# Altium schematic symbol library 13-Analog D 数模模数.SchLib: 573 symbols (part 3 of 6) (continued)
## DAC904 (continued)

## DAC1220E
designator IC?
20-Bit, Low-Power Digital-to-Analog Converter
pins: 1 DVDD (power), 2 XOUT (out), 3 XIN (in), 4 DGND (power), 5 AVDD (power), 6 DNC, 7 DNC, 8 DNC, 9 C1, 10 C2, 11 VOUT (out), 12 VREF (in), 13 AGND (power), 14 ~{CS} (in), 15 SDIO (io), 16 SCLK (in)

## DAC5311
designator IC?
1.8V to 5.5V, 80uA, 8-Bit, Low-Power, Single-Channel, DAC
pins: 1 ~{SYNC} (in), 2 SCLK (in), 3 DIN (in), 4 AVDD (power), 5 GND (power), 6 VOUT (out)

## DAC5578SRGE
designator IC?
8-Bit, Octal-Channel, Ultra-Low Glitch, Voltage Output, Two-Wire Interface Digital-to-Analog Converter
pins: 1 NC (out), 2 AVDD (power), 3 VOUTA (out), 4 VOUTC (out), 5 VOUTE (out), 6 VOUTG (out), 7 NC, 8 VREFIN (in), 9 RSTSEL (in), 10 ADDR1 (in), 11 ADDR0 (in), 12 ~{CLR} (in), 13 VOUTH (out), 14 VOUTF (out), 15 VOUTD (out), 16 VOUTB (out), 17 GND (power), 18 NC, 19 SDA (in), 20 SCL (in), 21 TWOC (in), 22 ~{LDAC} (in), 23 NC, 24 NC, 25 EP (power)

## DAC7612
designator IC?
Dual, 12-Bit Serial Input Digital-To-Analog Converter
pins: 1 SDI (in), 2 CLK (in), 3 ~{LDDACS} (in), 4 ~{CS} (in), 5 VOUTB (out), 6 GND (power), 7 VDD (in), 8 VOUTA (out)

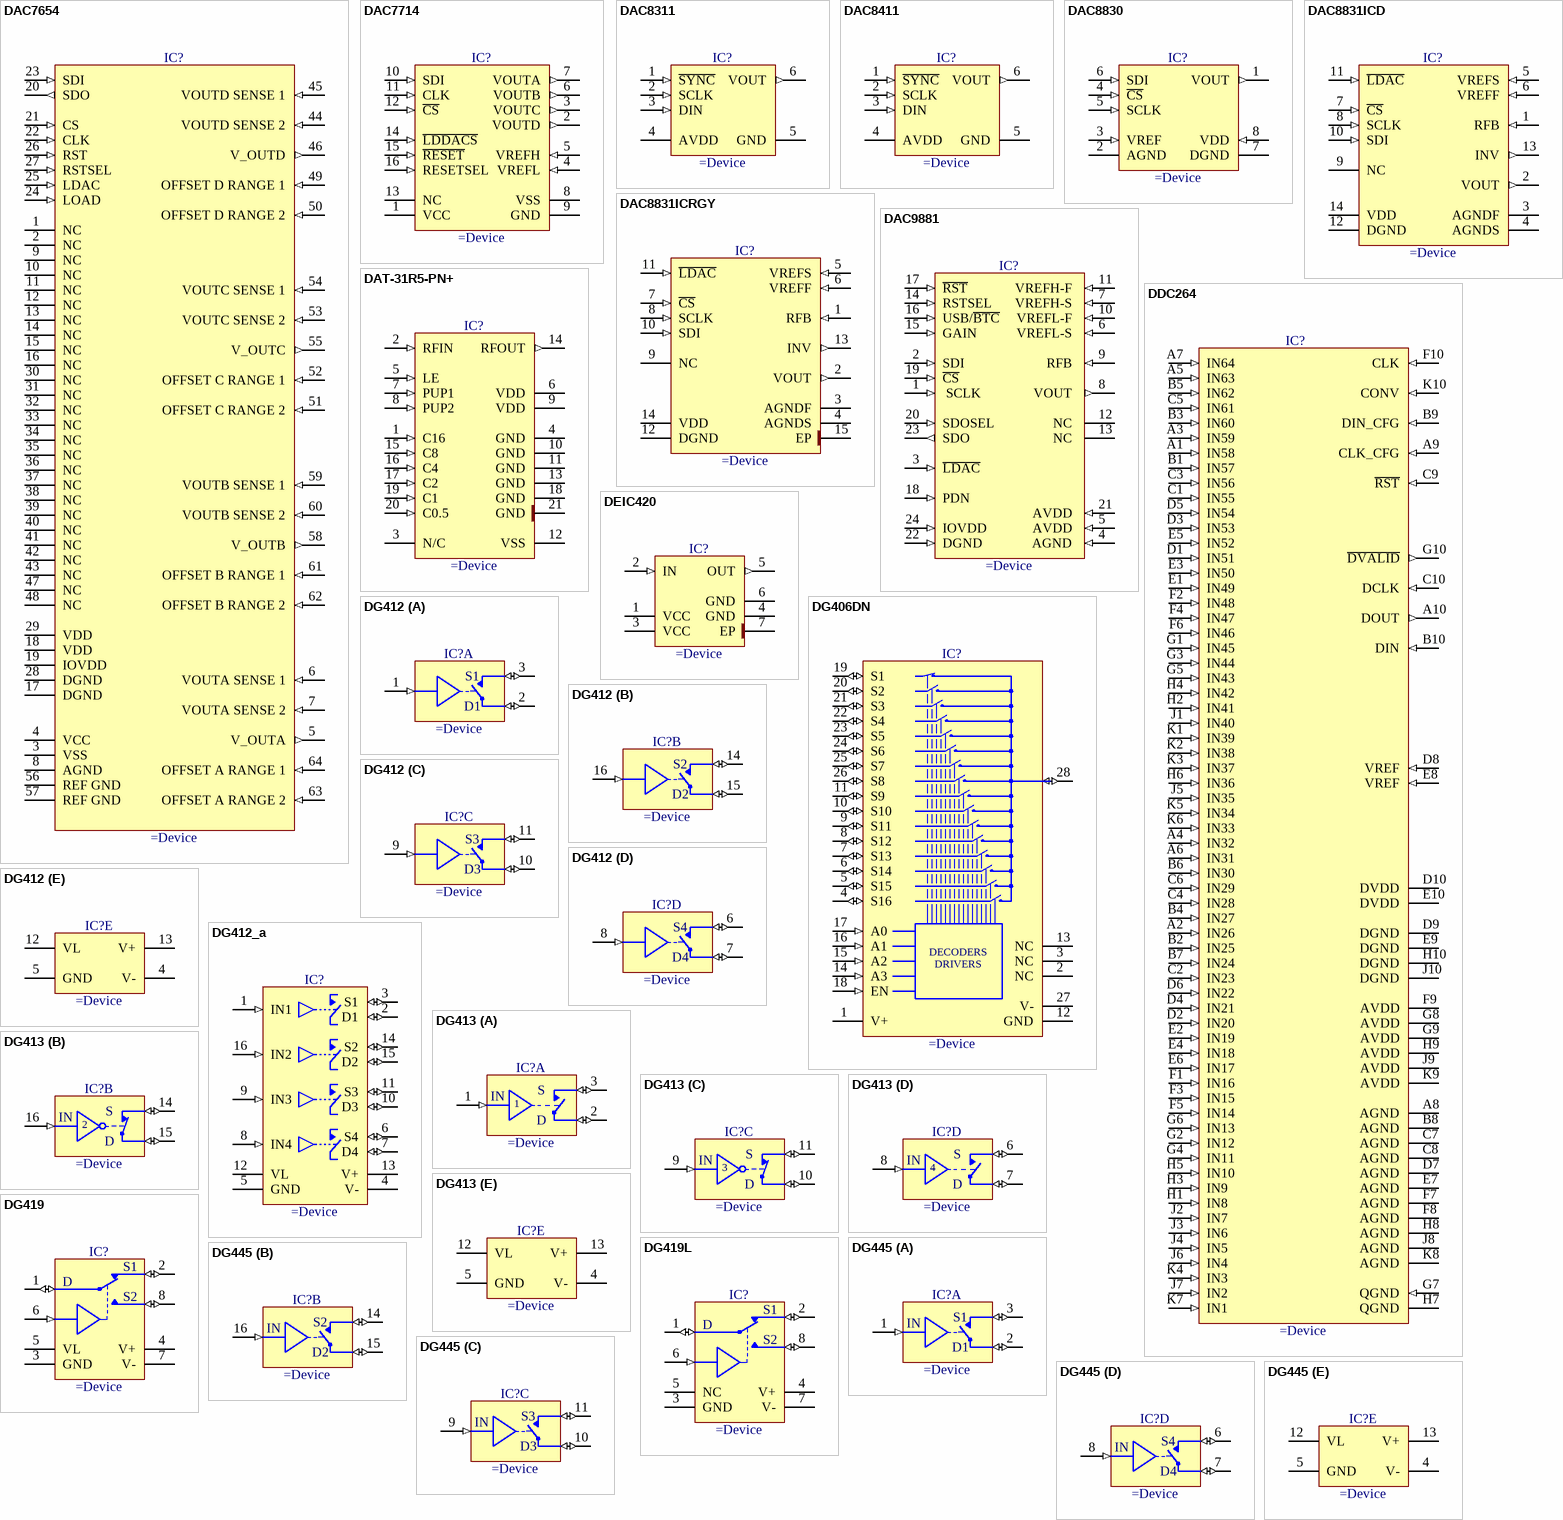
[diagram p18: symbols DAC7654 to DG445]

## DAC7654
designator IC?
16-Bit Quad Voltage Output DAC
pins: 1 NC, 2 NC, 3 VSS (power), 4 VCC (power), 5 V_OUTA (out), 6 VOUTA SENSE 1 (in), 7 VOUTA SENSE 2 (in), 8 AGND (power), 9 NC, 10 NC, 11 NC, 12 NC, 13 NC, 14 NC, 15 NC, 16 NC, 17 DGND (power), 18 VDD (power), 19 IOVDD (power), 20 SDO (out), 21 CS (in), 22 CLK (in), 23 SDI (in), 24 LOAD (in), 25 LDAC (in), 26 RST (in), 27 RSTSEL (in), 28 DGND (power), 29 VDD (power), 30 NC, 31 NC, 32 NC, 33 NC, 34 NC, 35 NC, 36 NC, 37 NC, 38 NC, 39 NC, 40 NC, 41 NC, 42 NC, 43 NC, 44 VOUTD SENSE 2 (in), 45 VOUTD SENSE 1 (in), 46 V_OUTD (out), 47 NC, 48 NC, 49 OFFSET D RANGE 1 (in), 50 OFFSET D RANGE 2 (in), 51 OFFSET C RANGE 2 (in), 52 OFFSET C RANGE 1 (in), 53 VOUTC SENSE 2 (in), 54 VOUTC SENSE 1 (in), 55 V_OUTC (out), 56 REF GND (power), 57 REF GND (power), 58 V_OUTB (out), 59 VOUTB SENSE 1 (in), 60 VOUTB SENSE 2 (in), 61 OFFSET B RANGE 1 (in), 62 OFFSET B RANGE 2 (in), 63 OFFSET A RANGE 2 (in), 64 OFFSET A RANGE 1 (in)

## DAC7714
designator IC?
Quad, Serial Input, 12-Bit, Voltage Output DAC
pins: 1 VCC (power), 2 VOUTD (out), 3 VOUTC (out), 4 VREFL (in), 5 VREFH (in), 6 VOUTB (out), 7 VOUTA (out), 8 VSS (power), 9 GND (power), 10 SDI (in), 11 CLK (in), 12 ~{CS} (in), 13 NC, 14 ~{LDDACS} (in), 15 ~{RESET} (in), 16 RESETSEL (in)

## DAC8311
designator IC?
1.8V to 5.5V, 80uA, 14-Bit, Low-Power, Single-Channel, DAC
pins: 1 ~{SYNC} (in), 2 SCLK (in), 3 DIN (in), 4 AVDD (power), 5 GND (power), 6 VOUT (out)

## DAC8411
designator IC?
2.0V to 5.5V, 80μA, 16-Bit, Low-Power, Single-Channel, Digital-to-Analog Converter
pins: 1 ~{SYNC} (in), 2 SCLK (in), 3 DIN (in), 4 AVDD (power), 5 GND (power), 6 VOUT (out)

## DAC8830
designator IC?
16-Bit, Ultra-Low Power, Voltage-Output DAC
pins: 1 VOUT (out), 2 AGND (power), 3 VREF (in), 4 ~{CS} (in), 5 SCLK (in), 6 SDI (in), 7 DGND (power), 8 VDD (in)

## DAC8831ICD
designator IC?
16-Bit, Ultra-Low Power, Voltage-Output Digital-to-Analog Converter
pins: 1 RFB (in), 2 VOUT (out), 3 AGNDF (power), 4 AGNDS (power), 5 VREFS (in), 6 VREFF (in), 7 ~{CS} (in), 8 SCLK (in), 9 NC, 10 SDI (in), 11 ~{LDAC} (in), 12 DGND (power), 13 INV (out), 14 VDD (power)

## DAC8831ICRGY
designator IC?
16-Bit, Ultra-Low Power, Voltage-Output Digital-to-Analog Converter
pins: 1 RFB (in), 2 VOUT (out), 3 AGNDF (power), 4 AGNDS (power), 5 VREFS (in), 6 VREFF (in), 7 ~{CS} (in), 8 SCLK (in), 9 NC, 10 SDI (in), 11 ~{LDAC} (in), 12 DGND (power), 13 INV (out), 14 VDD (power), 15 EP (power)

## DAC9881
designator IC?
18-Bit, Single-Channel, Low-Noise, Voltage-Output DAC
pins: 1  SCLK  (in), 2 SDI  (in), 3 ~{LDAC}  (in), 4 AGND  (in), 5 AVDD  (in), 6 VREFL-S  (in), 7 VREFH-S  (in), 8 VOUT  (out), 9 RFB  (in), 10 VREFL-F  (in), 11 VREFH-F  (in), 12 NC , 13 NC , 14 RSTSEL  (in), 15 GAIN  (in), 16 USB/~{BTC}  (in), 17 ~{RST}  (in), 18 PDN  (in), 19 ~{CS}  (in), 20 SDOSEL  (in), 21 AVDD  (in), 22 DGND  (in), 23 SDO  (out), 24 IOVDD  (in)

## DAT-31R5-PN+
designator IC?
6 Bit, Parallel Control Interface, Dual Supply Voltage 50 Ohm DC-2400MHz Digital Step Attenuator
pins: 1 C16 (in), 2 RFIN (in), 3 N/C, 4 GND (power), 5 LE (in), 6 VDD (power), 7 PUP1 (in), 8 PUP2 (in), 9 VDD (power), 10 GND (power), 11 GND (power), 12 VSS (power), 13 GND (power), 14 RFOUT (out), 15 C8 (in), 16 C4 (in), 17 C2 (in), 18 GND (power), 19 C1 (in), 20 C0.5 (in), 21 GND (power)

## DDC264
designator IC?
64-Channel, Current-Input Analog-to-Digital Converter
pins: A1 IN58 (in), A2 IN26 (in), A3 IN59 (in), A4 IN32 (in), A5 IN63 (in), A6 IN31 (in), A7 IN64 (in), A8 AGND (power), A9 CLK_CFG (in), A10 DOUT (out), B1 IN57 (in), B2 IN25 (in), B3 IN60 (in), B4 IN27 (in), B5 IN62 (in), B6 IN30 (in), B7 IN24 (in), B8 AGND (power), B9 DIN_CFG (in), B10 DIN (in), C1 IN55 (in), C2 IN23 (in), C3 IN56 (in), C4 IN28 (in), C5 IN61 (in), C6 IN29 (in), C7 AGND (power), C8 AGND (power), C9 ~{RST} (in), C10 DCLK (in), D1 IN51 (in), D2 IN20 (in), D3 IN53 (in), D4 IN21 (in), D5 IN54 (in), D6 IN22 (in), D7 AGND (power), D8 VREF (in), D9 DGND (power), D10 DVDD (power), E1 IN49 (in), E2 IN19 (in), E3 IN50 (in), E4 IN18 (in), E5 IN52 (in), E6 IN17 (in), E7 AGND (power), E8 VREF (in), E9 DGND (power), E10 DVDD (power), F1 IN16 (in), F2 IN48 (in), F3 IN15 (in), F4 IN47 (in), F5 IN14 (in), F6 IN46 (in), F7 AGND (power), F8 AGND (power), F9 AVDD (power), F10 CLK (in), G1 IN45 (in), G2 IN12 (in), G3 IN44 (in), G4 IN11 (in), G5 IN43 (in), G6 IN13 (in), G7 QGND (in), G8 AVDD (power), G9 AVDD (power), G10 ~{DVALID} (out), H1 IN8 (in), H2 IN41 (in), H3 IN9 (in), H4 IN42 (in), H5 IN10 (in), H6 IN36 (in), H7 QGND (power), H8 AGND (power), H9 AVDD (power), H10 DGND (power), J1 IN40 (in), J2 IN7 (in), J3 IN6 (in), J4 IN5 (in), J5 IN35 (in), J6 IN4 (in), J7 IN2 (in), J8 AGND (power), J9 AVDD (power), J10 DGND (power), K1 IN39 (in), K2 IN38 (in), K3 IN37 (in), K4 IN3 (in), K5 IN34 (in), K6 IN33 (in), K7 IN1 (in), K8 AGND (power), K9 AVDD (power), K10 CONV (in)

## DEIC420
designator IC?
20 Ampere Low-Side Ultrafast RF MOSFET Driver
pins: 1 VCC (power), 2 IN (in), 3 VCC (power), 4 GND (power), 5 OUT (out), 6 GND (power), 7 EP (power)

## DG406DN
designator IC?
16-Channel High-Performance CMOS Analog Multiplexer
pins: 1 V+ (power), 2 NC, 3 NC, 4 S16 (io), 5 S15 (io), 6 S14 (io), 7 S13 (io), 8 S12 (io), 9 S11 (io), 10 S10 (io), 11 S9 (io), 12 GND (power), 13 NC, 14 A3 (in), 15 A2 (in), 16 A1 (in), 17 A0 (in), 18 EN (in), 19 S1 (io), 20 S2 (io), 21 S3 (io), 22 S4 (io), 23 S5 (io), 24 S6 (io), 25 S7 (io), 26 S8 (io), 27 V- (power), 28 D (io)
text: DECODERS; DRIVERS

## DG412
designator IC?
Quad SPST CMOS Analog  Switches
part A pins: 1 IN (in), 2 D (io), 3 S (io)
part B pins: 14 S (io), 15 D (io), 16 IN (in)
part C pins: 9 IN (in), 10 D (io), 11 S (io)
part D pins: 6 S (io), 7 D (io), 8 IN (in)
part E pins: 4 V- (power), 5 GND (power), 12 VL (power), 13 V+ (power)
part A text: S1; D1
part B text: S2; D2
part C text: S3; D3
part D text: S4; D4

## DG412_a
designator IC?
Quad SPST CMOS Analog  Switches
pins: 1 IN1 (in), 2 D1 (io), 3 S1 (io), 4 V- (power), 5 GND (power), 6 S4 (io), 7 D4 (io), 8 IN4 (in), 9 IN3 (in), 10 D3 (io), 11 S3 (io), 12 VL (power), 13 V+ (power), 14 S2 (io), 15 D2 (io), 16 IN2 (in)

## DG413
designator IC?
Improved, Quad SPST Analog Switches (2 Normally Open + 2 Normally Close)
part A pins: 1 IN (in), 2 D (io), 3 S (io)
part B pins: 14 S (io), 15 D (io), 16 IN (in)
part C pins: 9 IN (in), 10 D3 (io), 11 S3 (io)
part D pins: 6 S4 (io), 7 D4 (io), 8 IN (in)
part E pins: 4 V- (power), 5 GND (power), 12 VL (power), 13 V+ (power)

## DG419
designator IC?
Improved, SPDT Analog Switches
pins: 1 D (io), 2 S1 (io), 3 GND (power), 4 V+ (power), 5 VL (power), 6 IN (in), 7 V- (power), 8 S2 (io)

## DG419L
designator IC?
35 Ohm, SPST/SPDT, +3V Logic-Compatible Analog SPDT Switches
pins: 1 D (io), 2 S1 (io), 3 GND (power), 4 V+ (power), 5 NC, 6 IN (in), 7 V- (power), 8 S2 (io)

## DG445
designator IC?
Quad SPST Switches
part A pins: 1 IN (in), 2 D (io), 3 S (io)
part B pins: 14 S (io), 15 D (io), 16 IN (in)
part C pins: 9 IN (in), 10 D (io), 11 S (io)
part D pins: 6 S (io), 7 D (io), 8 IN (in)
part E pins: 4 V- (power), 5 GND (power), 12 VL (power), 13 V+ (power)
part A text: S1; D1
part B text: S2; D2
part C text: S3; D3
part D text: S4; D4

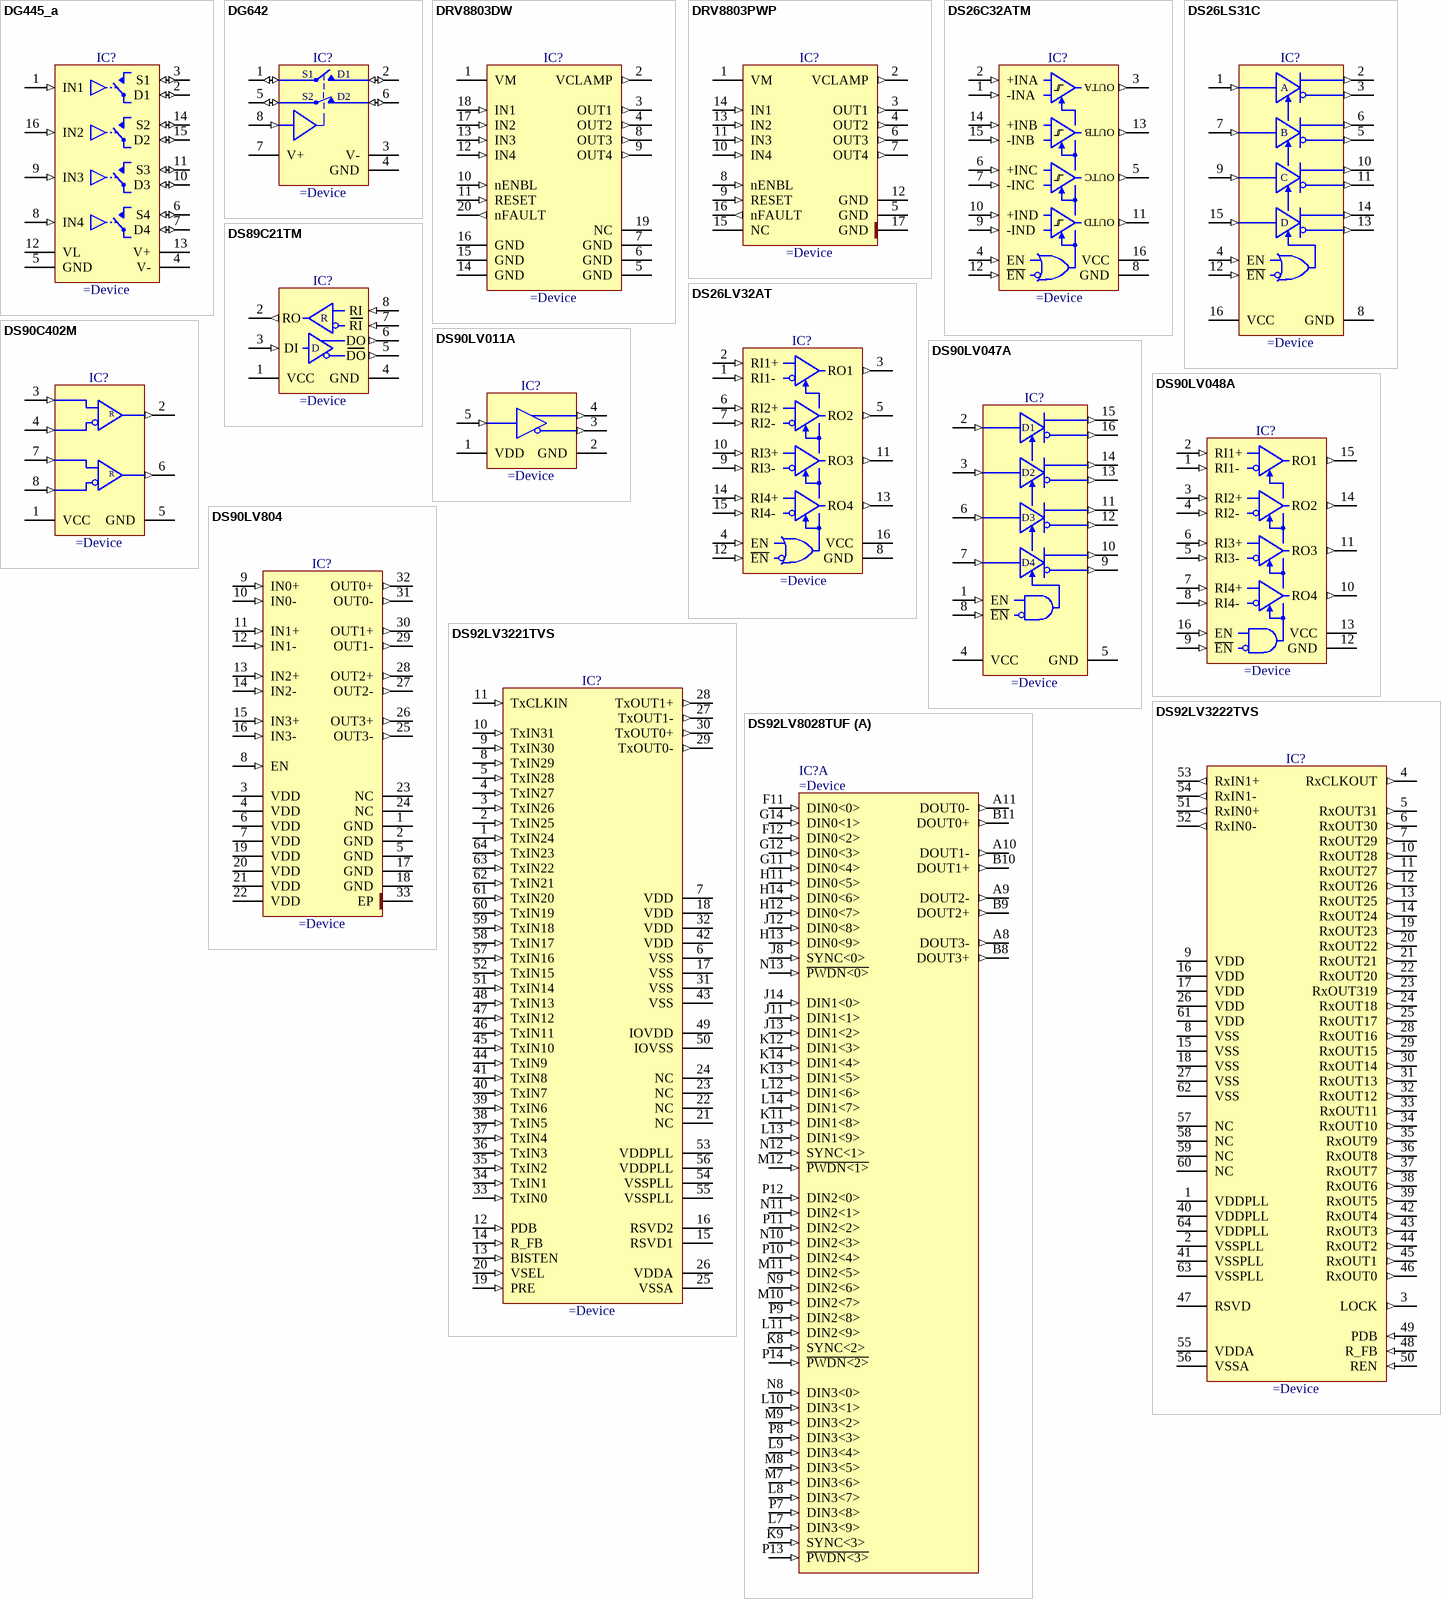
[diagram p19: symbols DG445_a to DS92LV8028TUF]

## DG445_a
designator IC?
Quad SPST Switches
pins: 1 IN1 (in), 2 D1 (io), 3 S1 (io), 4 V- (power), 5 GND (power), 6 S4 (io), 7 D4 (io), 8 IN4 (in), 9 IN3 (in), 10 D3 (io), 11 S3 (io), 12 VL (power), 13 V+ (power), 14 S2 (io), 15 D2 (io), 16 IN2 (in)

## DG642
designator IC?
Low On-Resistance Wideband/Video Switches
pins: 1 S1 (io), 2 D1 (io), 3 V- (power), 4 GND (power), 5 S2 (io), 6 D2 (io), 7 V+ (power), 8 IN (in)

## DRV8803DW
designator IC?
2.0A Unipolar Stepper Motor or 1A Quad Solenoid/Relay Driver (PWM Ctrl)
pins: 1 VM (power), 2 VCLAMP (out), 3 OUT1 (out), 4 OUT2 (out), 5 GND (power), 6 GND (power), 7 GND (power), 8 OUT3 (out), 9 OUT4 (out), 10 nENBL (in), 11 RESET (in), 12 IN4 (in), 13 IN3 (in), 14 GND (power), 15 GND (power), 16 GND (power), 17 IN2 (in), 18 IN1 (in), 19 NC, 20 nFAULT (out)

## DRV8803PWP
designator IC?
2.0A Unipolar Stepper Motor or 1A Quad Solenoid/Relay Driver (PWM Ctrl)
pins: 1 VM (power), 2 VCLAMP (out), 3 OUT1 (out), 4 OUT2 (out), 5 GND (power), 6 OUT3 (out), 7 OUT4 (out), 8 nENBL (in), 9 RESET (in), 10 IN4 (in), 11 IN3 (in), 12 GND (power), 13 IN2 (in), 14 IN1 (in), 15 NC, 16 nFAULT (out), 17 GND (power)

## DS26C32ATM
designator IC?
Quad Differential Line Receiver
pins: 1 -INA (in), 2 +INA (in), 3 OUTA (out), 4 EN (in), 5 OUTC (out), 6 +INC (in), 7 -INC (in), 8 GND (power), 9 -IND (in), 10 +IND (in), 11 OUTD (out), 12 ~{EN} (in), 13 OUTC (out), 14 +INB (in), 15 -INB (in), 16 VCC (power)
text: OUTB

## DS26LS31C
designator IC?
Quad High Speed Differential Line Driver
pins: 1 INA (in), 2 OA+ (out), 3 OA- (out), 4 EN (in), 5 OB- (out), 6 OB+ (out), 7 INB (in), 8 GND (power), 9 INC (in), 10 OC+ (out), 11 OC- (out), 12 ~{EN} (in), 13 OD- (out), 14 OD+ (out), 15 IND (in), 16 VCC (power)
text: A; B; C; D

## DS26LV32AT
designator IC?
3V Enhanced CMOS Quad Differential Line Receiver
pins: 1 RI1- (in), 2 RI1+ (in), 3 RO1 (out), 4 EN (in), 5 RO2 (out), 6 RI2+ (in), 7 RI2- (in), 8 GND (power), 9 RI3- (in), 10 RI3+ (in), 11 RO3 (out), 12 ~{EN} (in), 13 RO4 (out), 14 RI4+ (in), 15 RI4- (in), 16 VCC (power)

## DS89C21TM
designator IC?
Differential CMOS Line Driver and Receiver Pair
pins: 1 VCC (power), 2 RO (out), 3 DI (in), 4 GND (power), 5 ~{DO} (out), 6 DO (out), 7 ~{RI} (in), 8 RI (in)
text: R; D

## DS90C402M
designator IC?
Dual Low Voltage Differential Signaling (LVDS) Receiver
pins: 1 VCC (power), 2 RO1 (out), 3 RI1+ (in), 4 RI1- (in), 5 GND (power), 6 RO2 (out), 7 RI2+ (in), 8 RI2- (in)
text: R

## DS90LV011A
designator IC?
3V LVDS Single High Speed Differential Driver
pins: 1 VDD (power), 2 GND (power), 3 OUT- (out), 4 OUT+ (out), 5 TTLIN (in)

## DS90LV047A
designator IC?
3V LVDS Quad CMOS Differential Line Driver
pins: 1 EN (in), 2 DIN1 (in), 3 DIN2 (in), 4 VCC (power), 5 GND (power), 6 DIN3 (in), 7 DIN4 (in), 8 ~{EN} (in), 9 DOUT4- (out), 10 DOUT4+ (out), 11 DOUT3+ (out), 12 DOUT3- (out), 13 DOUT2- (out), 14 DOUT2+ (out), 15 DOUT1+ (out), 16 DOUT1- (out)
text: D1; D2; D3; D4

## DS90LV048A
designator IC?
3V LVDS Quad CMOS Differential Line Receiver
pins: 1 RI1- (in), 2 RI1+ (in), 3 RI2+ (in), 4 RI2- (in), 5 RI3- (in), 6 RI3+ (in), 7 RI4+ (in), 8 RI4- (in), 9 ~{EN} (in), 10 RO4 (out), 11 RO3 (out), 12 GND (power), 13 VCC (power), 14 RO2 (out), 15 RO1 (out), 16 EN (in)

## DS90LV804
designator IC?
4-Channel 800 Mbps LVDS Buffer/Repeater
pins: 1 GND (power), 2 GND (power), 3 VDD (power), 4 VDD (power), 5 GND (power), 6 VDD (power), 7 VDD (power), 8 EN (in), 9 IN0+ (in), 10 IN0- (in), 11 IN1+ (in), 12 IN1- (in), 13 IN2+ (in), 14 IN2- (in), 15 IN3+ (in), 16 IN3- (in), 17 GND (power), 18 GND (power), 19 VDD (power), 20 VDD (power), 21 VDD (power), 22 VDD (power), 23 NC, 24 NC, 25 OUT3- (out), 26 OUT3+ (out), 27 OUT2- (out), 28 OUT2+ (out), 29 OUT1- (out), 30 OUT1+ (out), 31 OUT0- (out), 32 OUT0+ (out), 33 EP (power)

## DS92LV3221TVS
designator IC?
20-50 MHz 32-Bit Channel Link II Serializer
pins: 1 TxIN24 (in), 2 TxIN25 (in), 3 TxIN26 (in), 4 TxIN27 (in), 5 TxIN28 (in), 6 VSS (power), 7 VDD (power), 8 TxIN29 (in), 9 TxIN30 (in), 10 TxIN31 (in), 11 TxCLKIN (in), 12 PDB (in), 13 BISTEN (in), 14 R_FB (in), 15 RSVD1, 16 RSVD2, 17 VSS (power), 18 VDD (power), 19 PRE (in), 20 VSEL (in), 21 NC, 22 NC, 23 NC, 24 NC, 25 VSSA (power), 26 VDDA (power), 27 TxOUT1- (out), 28 TxOUT1+ (out), 29 TxOUT0- (out), 30 TxOUT0+ (out), 31 VSS (power), 32 VDD (power), 33 TxIN0 (in), 34 TxIN1 (in), 35 TxIN2 (in), 36 TxIN3 (in), 37 TxIN4 (in), 38 TxIN5 (in), 39 TxIN6 (in), 40 TxIN7 (in), 41 TxIN8 (in), 42 VDD (power), 43 VSS (power), 44 TxIN9 (in), 45 TxIN10 (in), 46 TxIN11 (in), 47 TxIN12 (in), 48 TxIN13 (in), 49 IOVDD (power), 50 IOVSS (power), 51 TxIN14 (in), 52 TxIN15 (in), 53 VDDPLL (power), 54 VSSPLL (power), 55 VSSPLL (power), 56 VDDPLL (power), 57 TxIN16 (in), 58 TxIN17 (in), 59 TxIN18 (in), 60 TxIN19 (in), 61 TxIN20 (in), 62 TxIN21 (in), 63 TxIN22 (in), 64 TxIN23 (in)

## DS92LV3222TVS
designator IC?
20-50 MHz 32-Bit Channel Link II Deserializer
pins: 1 VDDPLL (power), 2 VSSPLL (power), 3 LOCK (out), 4 RxCLKOUT (out), 5 RxOUT31 (out), 6 RxOUT30 (out), 7 RxOUT29 (out), 8 VSS (power), 9 VDD (power), 10 RxOUT28 (out), 11 RxOUT27 (out), 12 RxOUT26 (out), 13 RxOUT25 (out), 14 RxOUT24 (out), 15 VSS (power), 16 VDD (power), 17 VDD (power), 18 VSS (power), 19 RxOUT23 (out), 20 RxOUT22 (out), 21 RxOUT21 (out), 22 RxOUT20 (out), 23 RxOUT319 (out), 24 RxOUT18 (out), 25 RxOUT17 (out), 26 VDD (power), 27 VSS (power), 28 RxOUT16 (out), 29 RxOUT15 (out), 30 RxOUT14 (out), 31 RxOUT13 (out), 32 RxOUT12 (out), 33 RxOUT11 (out), 34 RxOUT10 (out), 35 RxOUT9 (out), 36 RxOUT8 (out), 37 RxOUT7 (out), 38 RxOUT6 (out), 39 RxOUT5 (out), 40 VDDPLL (power), 41 VSSPLL (power), 42 RxOUT4 (out), 43 RxOUT3 (out), 44 RxOUT2 (out), 45 RxOUT1 (out), 46 RxOUT0 (out), 47 RSVD, 48 R_FB (in), 49 PDB (in), 50 REN (in), 51 RxIN0+ (out), 52 RxIN0- (out), 53 RxIN1+ (out), 54 RxIN1- (out), 55 VDDA (power), 56 VSSA (power), 57 NC, 58 NC, 59 NC, 60 NC, 61 VDD (power), 62 VSS (power), 63 VSSPLL (power), 64 VDDPLL (power)

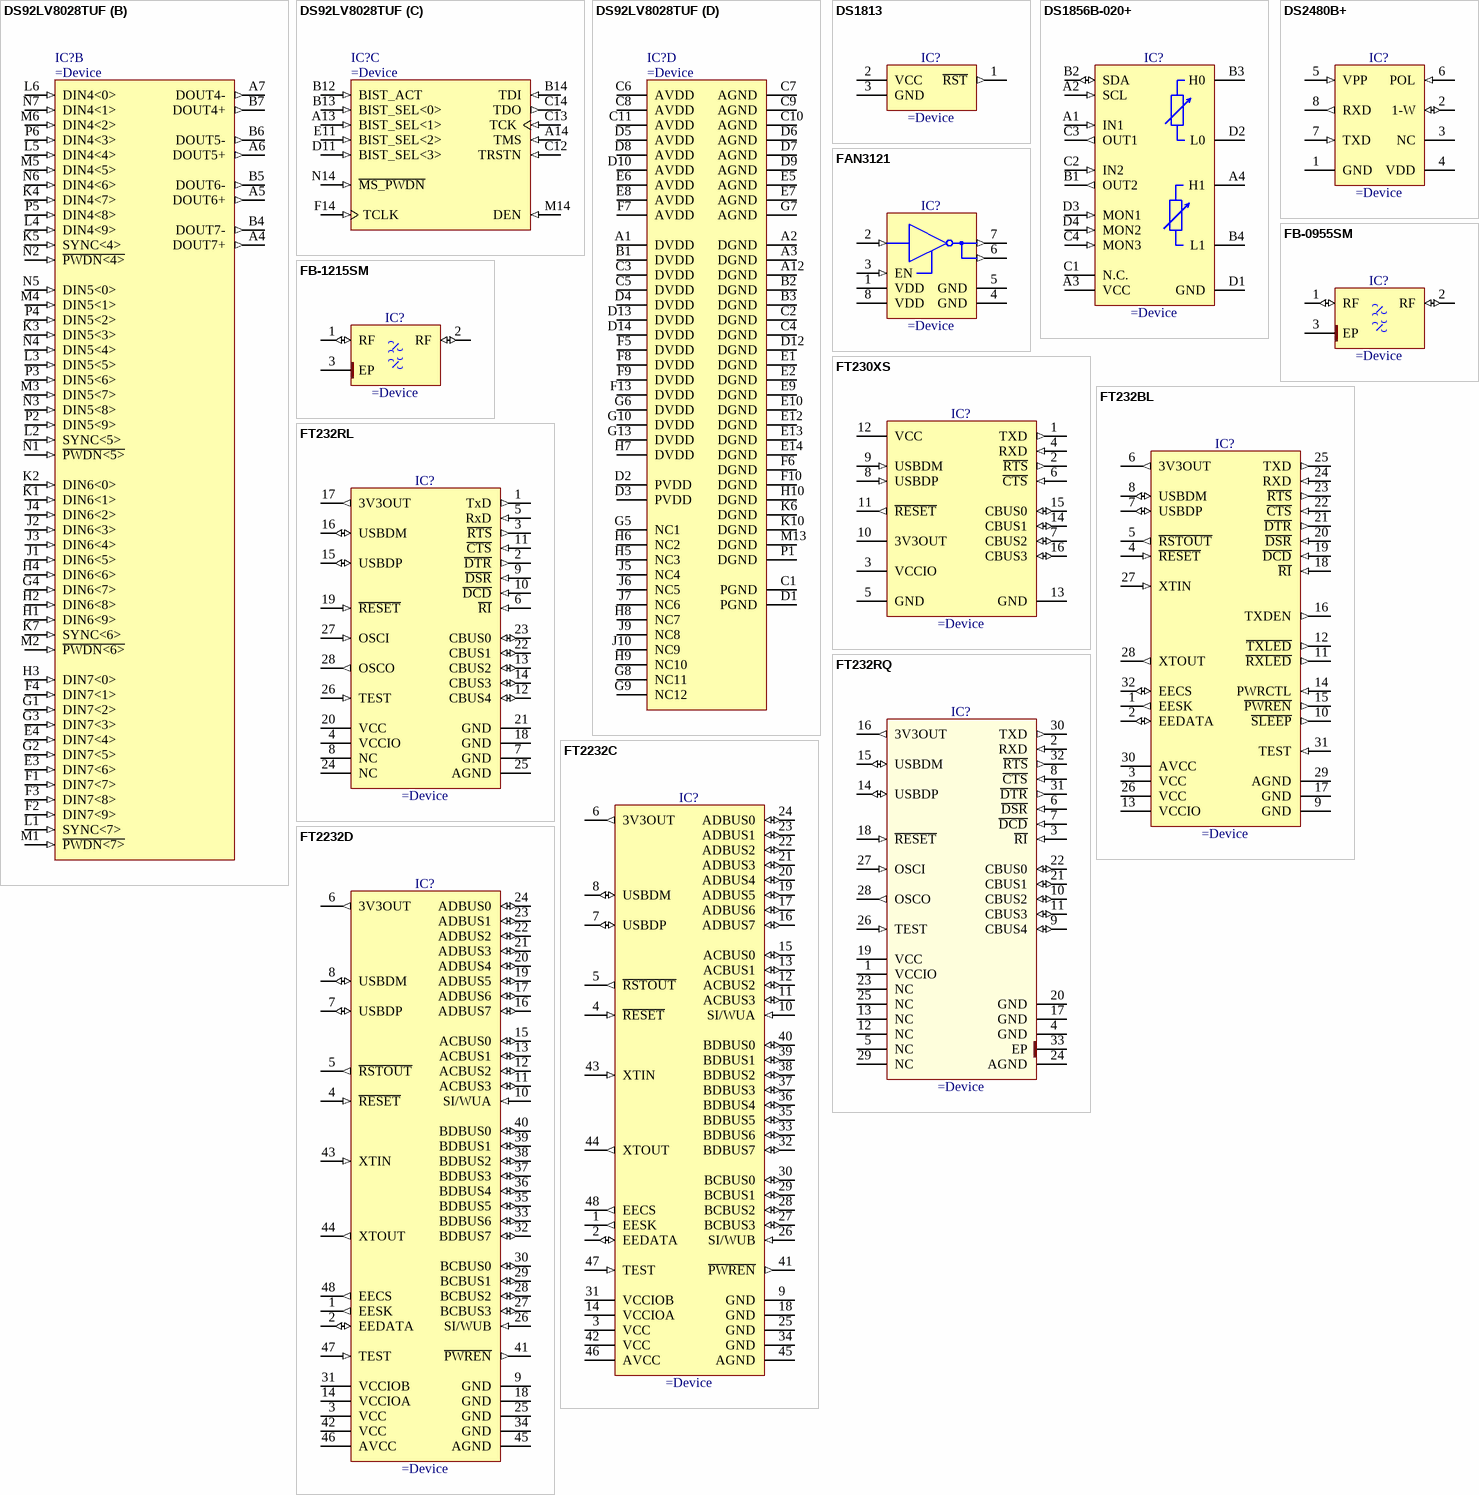
[diagram p20: symbols DS92LV8028TUF to FT2232D]

## DS92LV8028TUF
designator IC?
8 Channel 10:1 Serializer, 196-pin LBGA
part A pins: A8 DOUT3- (out), A9 DOUT2- (out), A10 DOUT1- (out), A11 DOUT0- (out), B8 DOUT3+ (out), B9 DOUT2+ (out), B10 DOUT1+ (out), B11 DOUT0+ (out), F11 DIN0<0> (in), F12 DIN0<2> (in), G11 DIN0<4> (in), G12 DIN0<3> (in), G14 DIN0<1> (in), H11 DIN0<5> (in), H12 DIN0<7> (in), H13 DIN0<9> (in), H14 DIN0<6> (in), J8 SYNC<0> (in), J11 DIN1<1> (in), J12 DIN0<8> (in), J13 DIN1<2> (in), J14 DIN1<0> (in), K8 SYNC<2> (in), K9 SYNC<3> (in), K11 DIN1<8> (in), K12 DIN1<3> (in), K13 DIN1<5> (in), K14 DIN1<4> (in), L7 DIN3<9> (in), L8 DIN3<7> (in), L9 DIN3<4> (in), L10 DIN3<1> (in), L11 DIN2<9> (in), L12 DIN1<6> (in), L13 DIN1<9> (in), L14 DIN1<7> (in), M7 DIN3<6> (in), M8 DIN3<5> (in), M9 DIN3<2> (in), M10 DIN2<7> (in), M11 DIN2<5> (in), M12 ~{PWDN<1>} (in), N8 DIN3<0> (in), N9 DIN2<6> (in), N10 DIN2<3> (in), N11 DIN2<1> (in), N12 SYNC<1> (in), N13 ~{PWDN<0>} (in), P7 DIN3<8> (in), P8 DIN3<3> (in), P9 DIN2<8> (in), P10 DIN2<4> (in), P11 DIN2<2> (in), P12 DIN2<0> (in), P13 ~{PWDN<3>} (in), P14 ~{PWDN<2>} (in)
part B pins: A4 DOUT7+ (out), A5 DOUT6+ (out), A6 DOUT5+ (out), A7 DOUT4- (out), B4 DOUT7- (out), B5 DOUT6- (out), B6 DOUT5- (out), B7 DOUT4+ (out), E3 DIN7<6> (in), E4 DIN7<4> (in), F1 DIN7<7> (in), F2 DIN7<9> (in), F3 DIN7<8> (in), F4 DIN7<1> (in), G1 DIN7<2> (in), G2 DIN7<5> (in), G3 DIN7<3> (in), G4 DIN6<7> (in), H1 DIN6<9> (in), H2 DIN6<8> (in), H3 DIN7<0> (in), H4 DIN6<6> (in), J1 DIN6<5> (in), J2 DIN6<3> (in), J3 DIN6<4> (in), J4 DIN6<2> (in), K1 DIN6<1> (in), K2 DIN6<0> (in), K3 DIN5<3> (in), K4 DIN4<7> (in), K5 SYNC<4> (in), K7 SYNC<6> (in), L1 SYNC<7> (in), L2 SYNC<5> (in), L3 DIN5<5> (in), L4 DIN4<9> (in), L5 DIN4<4> (in), L6 DIN4<0> (in), M1 ~{PWDN<7>} (in), M2 ~{PWDN<6>} (in), M3 DIN5<7> (in), M4 DIN5<1> (in), M5 DIN4<5> (in), M6 DIN4<2> (in), N1 ~{PWDN<5>} (in), N2 ~{PWDN<4>} (in), N3 DIN5<8> (in), N4 DIN5<4> (in), N5 DIN5<0> (in), N6 DIN4<6> (in), N7 DIN4<1> (in), P2 DIN5<9> (in), P3 DIN5<6> (in), P4 DIN5<2> (in), P5 DIN4<8> (in), P6 DIN4<3> (in)
part C pins: A13 BIST_SEL<1> (in), A14 TMS (in), B12 BIST_ACT (in), B13 BIST_SEL<0> (in), B14 TDI (in), C12 TRSTN (in), C13 TCK (in), C14 TDO (out), D11 BIST_SEL<3> (in), E11 BIST_SEL<2> (in), F14 TCLK (in), M14 DEN (in), N14 ~{MS_PWDN} (in)
part D pins: A1 DVDD (power), A2 DGND (power), A3 DGND (power), A12 DGND (power), B1 DVDD (power), B2 DGND (power), B3 DGND (power), C1 PGND (power), C2 DGND (power), C3 DVDD (power), C4 DGND (power), C5 DVDD (power), C6 AVDD (power), C7 AGND (power), C8 AVDD (power), C9 AGND (power), C10 AGND (power), C11 AVDD (power), D1 PGND (power), D2 PVDD (power), D3 PVDD (power), D4 DVDD (power), D5 AVDD (power), D6 AGND (power), D7 AGND (power), D8 AVDD (power), D9 AGND (power), D10 AVDD (power), D12 DGND (power), D13 DVDD (power), D14 DVDD (power), E1 DGND (power), E2 DGND (power), E5 AGND (power), E6 AVDD (power), E7 AGND (power), E8 AVDD (power), E9 DGND (power), E10 DGND (power), E12 DGND (power), E13 DGND (power), E14 DGND (power), F5 DVDD (power), F6 DGND (power), F7 AVDD (power), F8 DVDD (power), F9 DVDD (power), F10 DGND (power), F13 DVDD (power), G5 NC1, G6 DVDD (power), G7 AGND (power), G8 NC11, G9 NC12, G10 DVDD (power), G13 DVDD (power), H5 NC3, H6 NC2, H7 DVDD (power), H8 NC7, H9 NC10, H10 DGND (power), J5 NC4, J6 NC5, J7 NC6, J9 NC8, J10 NC9, K6 DGND (power), K10 DGND (power), M13 DGND (power), P1 DGND (power)

## DS1813
designator IC?
5V EconoReset with Pushbutton
pins: 1 ~{RST} (out), 2 VCC (power), 3 GND (power)

## DS1856B-020+
designator IC?
Dual, Temperature-Controlled Resistors with Internally Calibrated Monitors and Password Protection
pins: A1 IN1 (in), A2 SCL (in), A3 VCC (power), A4 H1, B1 OUT2 (out), B2 SDA (io), B3 H0, B4 L1, C1 N.C., C2 IN2 (in), C3 OUT1 (out), C4 MON3 (in), D1 GND (power), D2 L0, D3 MON1 (in), D4 MON2 (in)

## DS2480B+
designator IC?
Serial to 1-Wire Line Driver
pins: 1 GND (power), 2 1-W (io), 3 NC, 4 VDD (power), 5 VPP (in), 6 POL (in), 7 TXD (in), 8 RXD (out)

## FAN3121
designator IC?
Single 9A High-Speed, Low-Side Gate Driver
pins: 1 VDD (power), 2 IN (in), 3 EN (in), 4 GND (power), 5 GND (power), 6 ~{OUT} (out), 7 ~{OUT} (out), 8 VDD (power)

## FB-0955SM
designator IC?
9.55GHz Microwave Surface Mount Band Pass Filter
pins: 1 RF (io), 2 RF (io), 3 EP (power)

## FB-1215SM
designator IC?
12.15GHz Microwave Surface Mount Band Pass Filter
pins: 1 RF (io), 2 RF (io), 3 EP (power)

## FT230XS
designator IC?
USB To Basic UART IC
pins: 1 TXD (out), 2 ~{RTS} (out), 3 VCCIO (power), 4 RXD (in), 5 GND (power), 6 ~{CTS} (in), 7 CBUS2 (io), 8 USBDP (in), 9 USBDM (in), 10 3V3OUT (power), 11 ~{RESET} (out), 12 VCC (power), 13 GND (power), 14 CBUS1 (io), 15 CBUS0 (io), 16 CBUS3 (io)

## FT232BL
designator IC?
USB To Serial UART Device
pins: 1 EESK (out), 2 EEDATA (io), 3 VCC (power), 4 ~{RESET} (in), 5 ~{RSTOUT} (out), 6 3V3OUT (out), 7 USBDP (io), 8 USBDM (io), 9 GND (power), 10 ~{SLEEP} (out), 11 ~{RXLED} (out), 12 ~{TXLED} (out), 13 VCCIO (power), 14 PWRCTL (in), 15 ~{PWREN} (out), 16 TXDEN (out), 17 GND (power), 18 ~{RI} (in), 19 ~{DCD} (in), 20 ~{DSR} (in), 21 ~{DTR} (out), 22 ~{CTS} (in), 23 ~{RTS} (out), 24 RXD (in), 25 TXD (out), 26 VCC (power), 27 XTIN (in), 28 XTOUT (out), 29 AGND (power), 30 AVCC (power), 31 TEST (in), 32 EECS (io)

## FT232RL
designator IC?
USB to serial UART Interface
pins: 1 TxD (out), 2 ~{DTR} (out), 3 ~{RTS} (out), 4 VCCIO (power), 5 RxD (in), 6 ~{RI} (in), 7 GND (power), 8 NC, 9 ~{DSR} (in), 10 ~{DCD} (in), 11 ~{CTS} (in), 12 CBUS4 (io), 13 CBUS2 (io), 14 CBUS3 (io), 15 USBDP (io), 16 USBDM (io), 17 3V3OUT (out), 18 GND (power), 19 ~{RESET} (in), 20 VCC (power), 21 GND (power), 22 CBUS1 (io), 23 CBUS0 (io), 24 NC, 25 AGND (power), 26 TEST (in), 27 OSCI (in), 28 OSCO (out)

## FT232RQ
designator IC?
USB to serial UART Interface
pins: 1 VCCIO (power), 2 RXD (in), 3 ~{RI} (in), 4 GND (power), 5 NC, 6 ~{DSR} (in), 7 ~{DCD} (in), 8 ~{CTS} (in), 9 CBUS4 (io), 10 CBUS2 (io), 11 CBUS3 (io), 12 NC, 13 NC, 14 USBDP (io), 15 USBDM (io), 16 3V3OUT (out), 17 GND (power), 18 ~{RESET} (in), 19 VCC (power), 20 GND (power), 21 CBUS1 (io), 22 CBUS0 (io), 23 NC, 24 AGND (power), 25 NC, 26 TEST (in), 27 OSCI (in), 28 OSCO (out), 29 NC, 30 TXD (out), 31 ~{DTR} (out), 32 ~{RTS} (out), 33 EP (power)

## FT2232C
designator IC?
Dual USB UART / FIFO I.C.
pins: 1 EESK (out), 2 EEDATA (io), 3 VCC (power), 4 ~{RESET} (in), 5 ~{RSTOUT} (out), 6 3V3OUT (out), 7 USBDP (io), 8 USBDM (io), 9 GND (power), 10 SI/WUA (in), 11 ACBUS3 (io), 12 ACBUS2 (io), 13 ACBUS1 (io), 14 VCCIOA (power), 15 ACBUS0 (io), 16 ADBUS7 (io), 17 ADBUS6 (io), 18 GND (power), 19 ADBUS5 (io), 20 ADBUS4 (io), 21 ADBUS3 (io), 22 ADBUS2 (io), 23 ADBUS1 (io), 24 ADBUS0 (io), 25 GND (power), 26 SI/WUB (in), 27 BCBUS3 (io), 28 BCBUS2 (io), 29 BCBUS1 (io), 30 BCBUS0 (io), 31 VCCIOB (power), 32 BDBUS7 (io), 33 BDBUS6 (io), 34 GND (power), 35 BDBUS5 (io), 36 BDBUS4 (io), 37 BDBUS3 (io), 38 BDBUS2 (io), 39 BDBUS1 (io), 40 BDBUS0 (io), 41 ~{PWREN} (out), 42 VCC (power), 43 XTIN (in), 44 XTOUT (out), 45 AGND (power), 46 AVCC (power), 47 TEST (in), 48 EECS (out)

## FT2232D
designator IC?
Dual USB UART / FIFO I.C.
pins: 1 EESK (out), 2 EEDATA (io), 3 VCC (power), 4 ~{RESET} (in), 5 ~{RSTOUT} (out), 6 3V3OUT (out), 7 USBDP (io), 8 USBDM (io), 9 GND (power), 10 SI/WUA (in), 11 ACBUS3 (io), 12 ACBUS2 (io), 13 ACBUS1 (io), 14 VCCIOA (power), 15 ACBUS0 (io), 16 ADBUS7 (io), 17 ADBUS6 (io), 18 GND (power), 19 ADBUS5 (io), 20 ADBUS4 (io), 21 ADBUS3 (io), 22 ADBUS2 (io), 23 ADBUS1 (io), 24 ADBUS0 (io), 25 GND (power), 26 SI/WUB (in), 27 BCBUS3 (io), 28 BCBUS2 (io), 29 BCBUS1 (io), 30 BCBUS0 (io), 31 VCCIOB (power), 32 BDBUS7 (io), 33 BDBUS6 (io), 34 GND (power), 35 BDBUS5 (io), 36 BDBUS4 (io), 37 BDBUS3 (io), 38 BDBUS2 (io), 39 BDBUS1 (io), 40 BDBUS0 (io), 41 ~{PWREN} (out), 42 VCC (power), 43 XTIN (in), 44 XTOUT (out), 45 AGND (power), 46 AVCC (power), 47 TEST (in), 48 EECS (out)

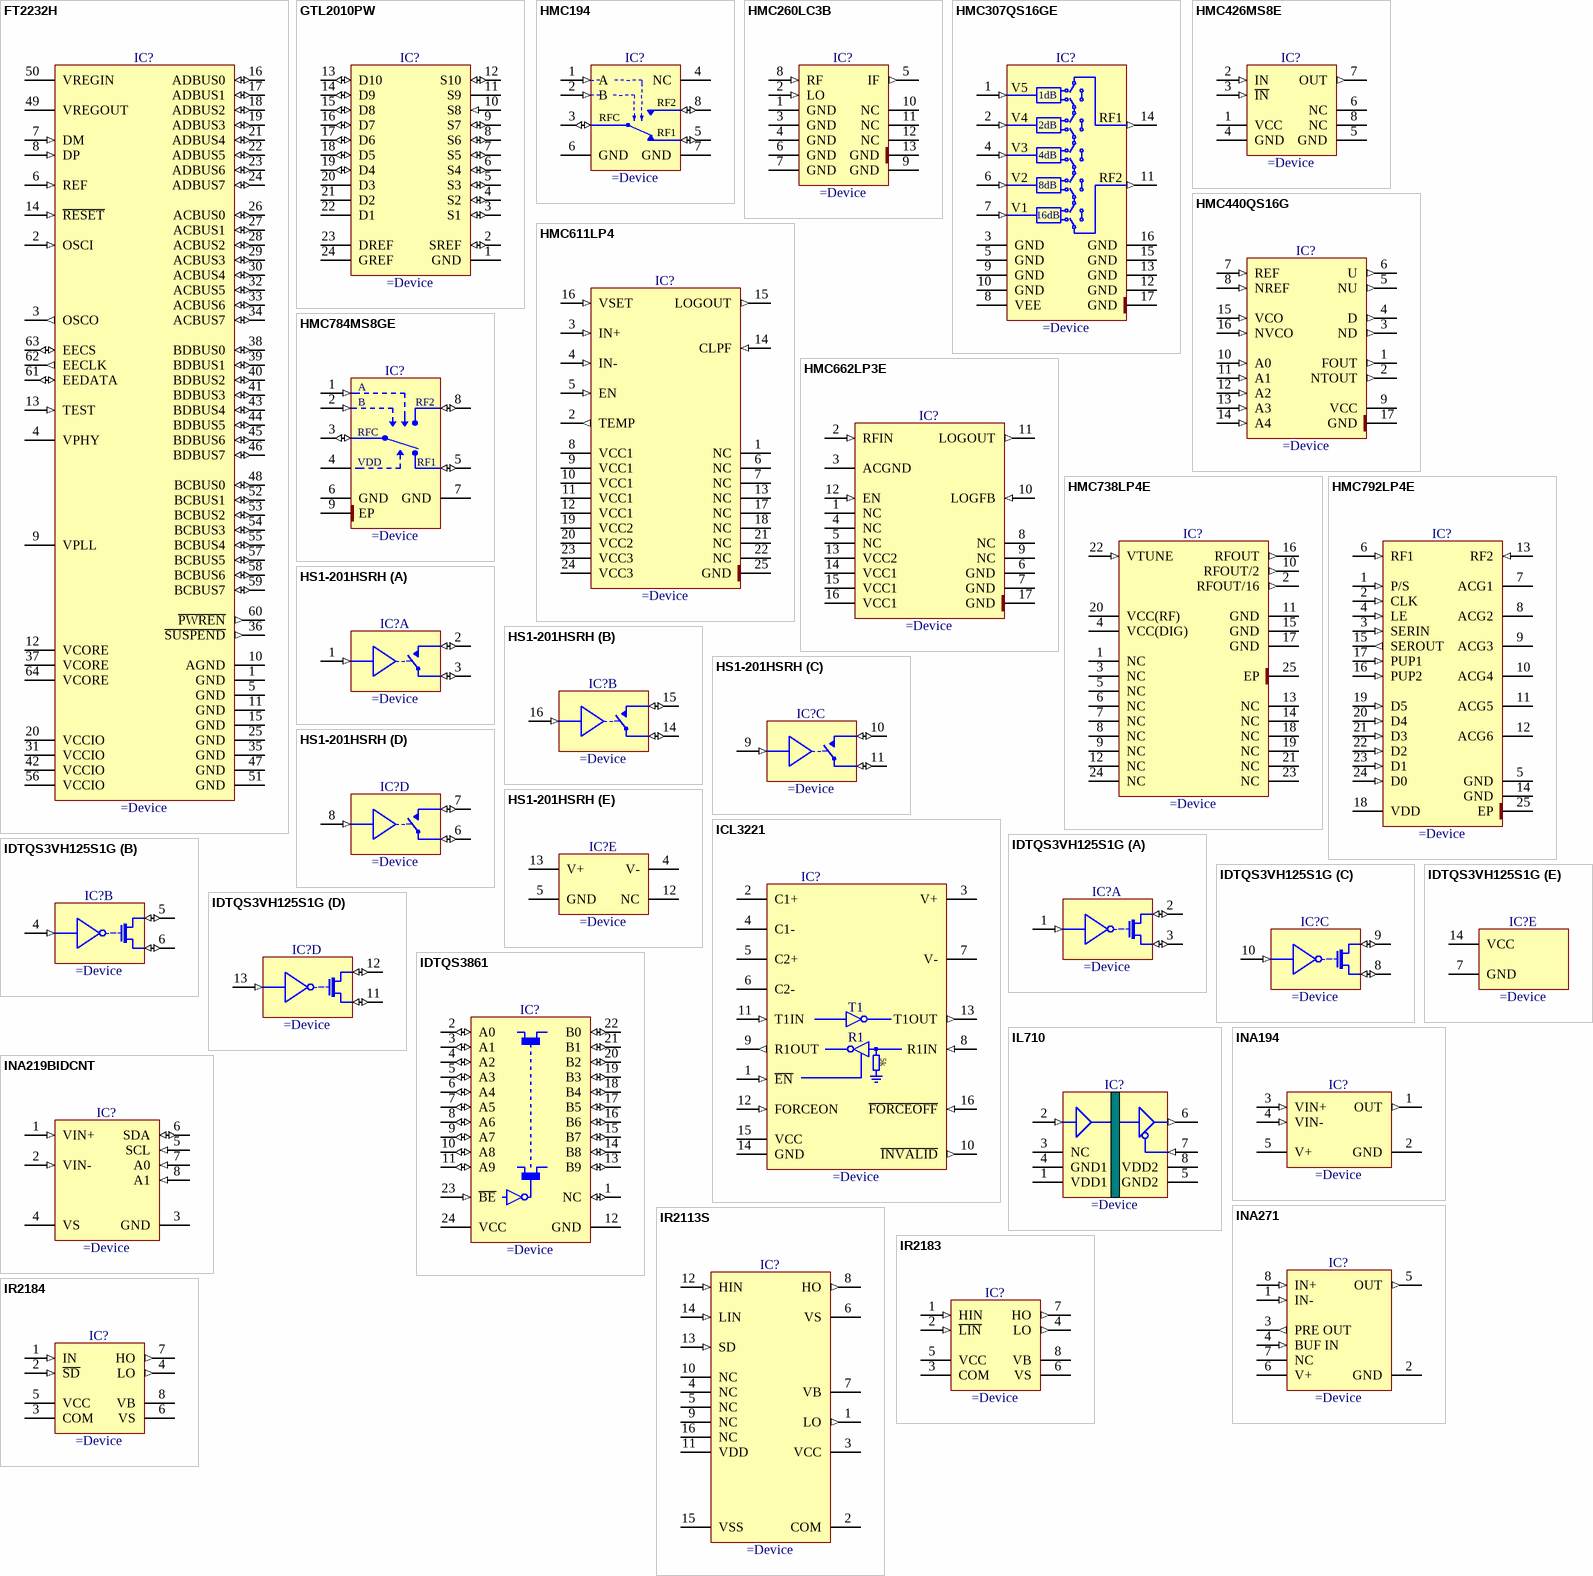
[diagram p21: symbols FT2232H to IR2184]

## FT2232H
designator IC?
Dual High Speed USB to Multipurpose UART/FIFO IC
pins: 1 GND (power), 2 OSCI (in), 3 OSCO (out), 4 VPHY (power), 5 GND (power), 6 REF (in), 7 DM (in), 8 DP (in), 9 VPLL (power), 10 AGND (power), 11 GND (power), 12 VCORE (power), 13 TEST (in), 14 ~{RESET} (in), 15 GND (power), 16 ADBUS0 (io), 17 ADBUS1 (io), 18 ADBUS2 (io), 19 ADBUS3 (io), 20 VCCIO (power), 21 ADBUS4 (io), 22 ADBUS5 (io), 23 ADBUS6 (io), 24 ADBUS7 (io), 25 GND (power), 26 ACBUS0 (io), 27 ACBUS1 (io), 28 ACBUS2 (io), 29 ACBUS3 (io), 30 ACBUS4 (io), 31 VCCIO (power), 32 ACBUS5 (io), 33 ACBUS6 (io), 34 ACBUS7 (io), 35 GND (power), 36 ~{SUSPEND} (out), 37 VCORE (power), 38 BDBUS0 (io), 39 BDBUS1 (io), 40 BDBUS2 (io), 41 BDBUS3 (io), 42 VCCIO (power), 43 BDBUS4 (io), 44 BDBUS5 (io), 45 BDBUS6 (io), 46 BDBUS7 (io), 47 GND (power), 48 BCBUS0 (io), 49 VREGOUT (power), 50 VREGIN (power), 51 GND (power), 52 BCBUS1 (io), 53 BCBUS2 (io), 54 BCBUS3 (io), 55 BCBUS4 (io), 56 VCCIO (power), 57 BCBUS5 (io), 58 BCBUS6 (io), 59 BCBUS7 (io), 60 ~{PWREN} (out), 61 EEDATA (io), 62 EECLK (out), 63 EECS (io), 64 VCORE (power)

## GTL2010PW
designator IC?
10-Bit Bidirectional Low Voltage Translator
pins: 1 GND (power), 2 SREF (io), 3 S1 (io), 4 S2 (io), 5 S3 (io), 6 S4 (io), 7 S5 (io), 8 S6 (io), 9 S7 (io), 10 S8 (in), 11 S9 (power), 12 S10 (io), 13 D10 (io), 14 D9 (io), 15 D8 (io), 16 D7 (io), 17 D6 (io), 18 D5 (io), 19 D4 (io), 20 D3 (power), 21 D2 (power), 22 D1 (power), 23 DREF (power), 24 GREF (power)